# Altium footprint library PcbLib1.PcbLib: 1009 footprints (part 11 of 64)
Each footprint in its own frame and in the unit in brackets; x right, y up, seen from the top. Pads: shape width x height; smd on the part's side, far side on the other; paste and mask are expansions set on the pad; w line width, h text height; cw(c..) or ccw(c..) is an arc to the next point about the centre after c.
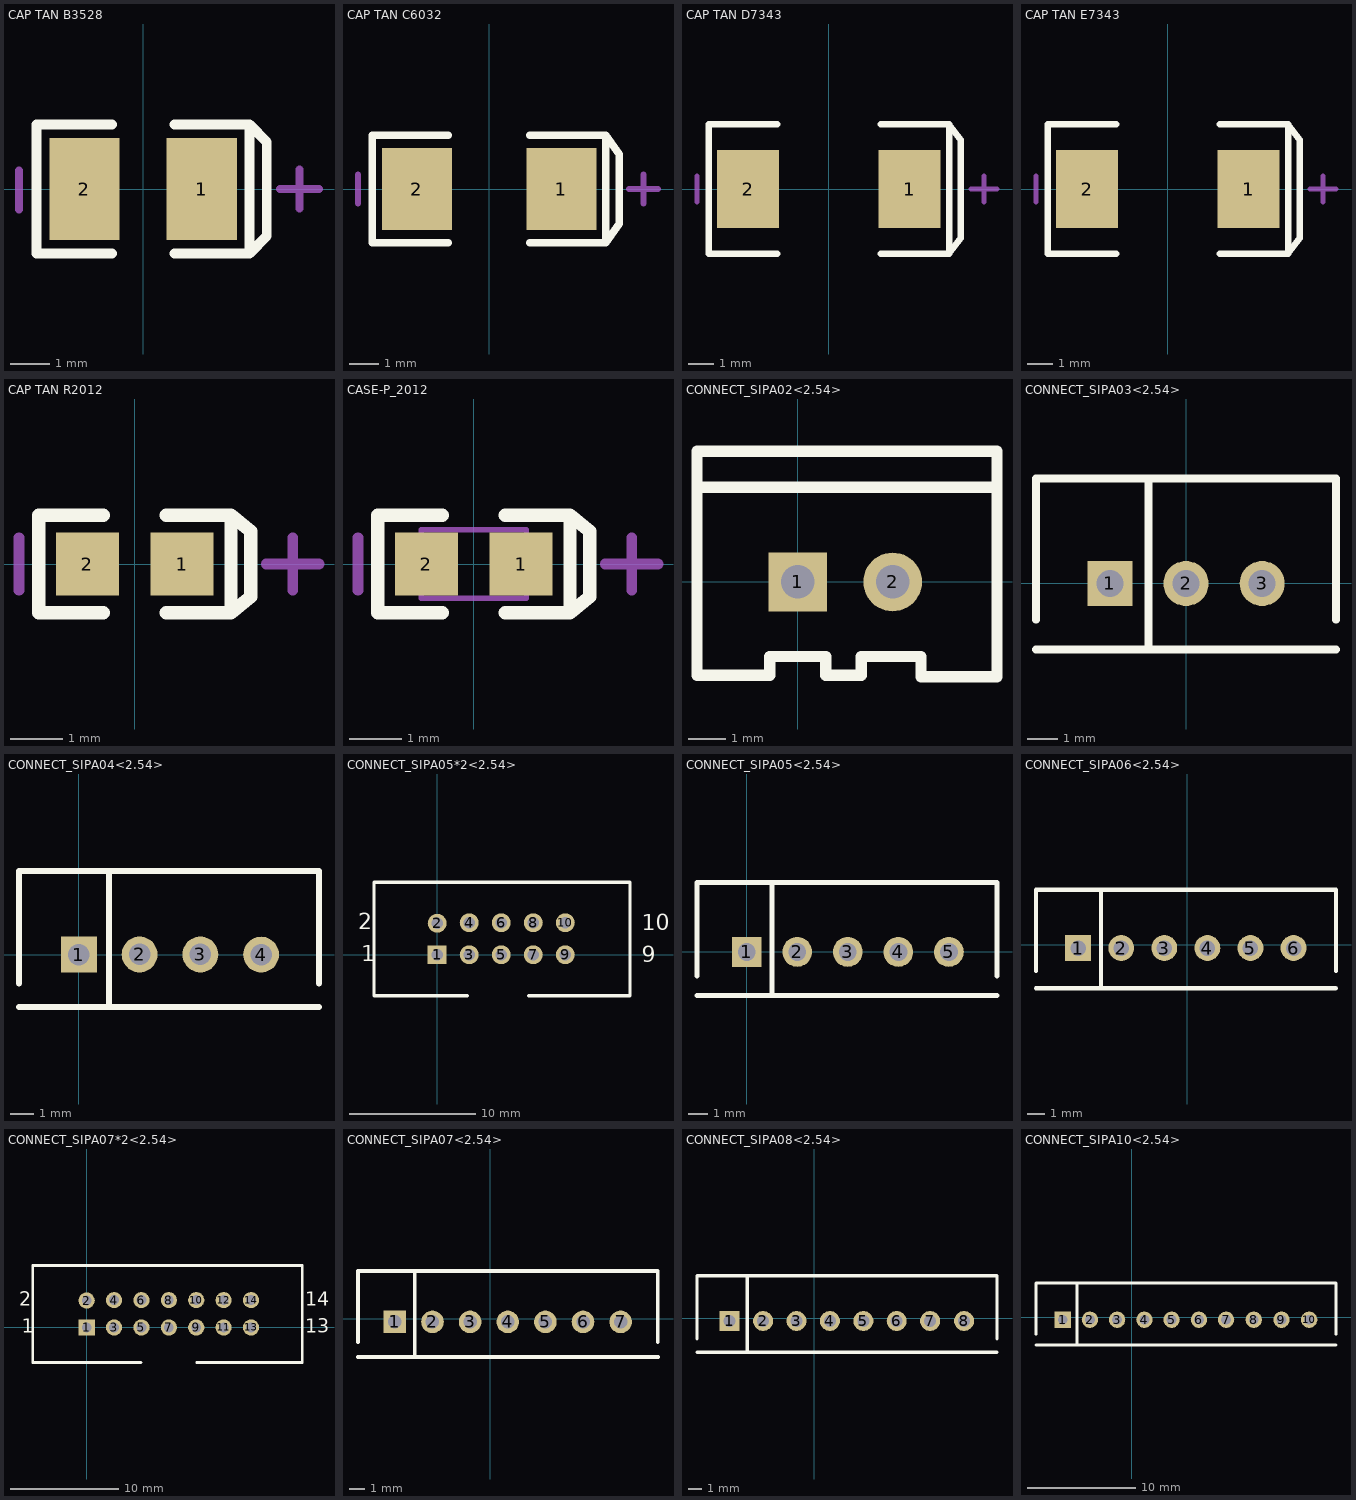
[diagram p10: the footprints below, top view; thin cyan lines are the x and y axes]

## CAP TAN B3528 [mm]
pads (2):
  rect 1.8x2.6 smd: 1(1.5,0) 2(-1.5,0)
Top Overlay:
  lines w0.254: -0.8,-1.65 -2.727,-1.65 -2.727,1.65 -0.8,1.65 ; 0.8,-1.65 2.727,-1.65 ; 0.8,1.65 2.727,1.65 ; 2.727,-1.65 3.163,-1.2 3.163,1.2 2.727,1.65 ; 2.727,-1.65 2.727,1.65
Mechanical 15:
  lines w0.203: -3.175,-0.525 -3.175,0.475 ; 3.5,0 4.5,0 ; 4,-0.5 4,0.5
3D body "User Library-AVX_BCASE.STEP": height 2.03, standoff 0, extent -1.85,-1.465 1.85,1.465

## CAP TAN C6032 [mm]
pads (2):
  rect 2.4x2.8 smd: 1(2.48,0) 2(-2.48,0)
Top Overlay:
  lines w0.254: -1.4,-1.85 -4.007,-1.85 -4.007,1.85 -1.4,1.85 ; 1.4,-1.85 4.007,-1.85 ; 1.4,1.85 4.007,1.85 ; 4.007,-1.85 4.47,-1.2 4.47,1.2 4.007,1.85 ; 4.007,-1.85 4.007,1.85
Mechanical 15:
  lines w0.203: -4.5,-0.5 -4.5,0.5 ; 4.8,0 5.8,0 ; 5.3,-0.5 5.3,0.5
3D body "User Library-AVX_C_CASE.STEP": height 2.7, standoff 0, extent -3.05,-1.675 3.05,1.675

## CAP TAN D7343 [mm]
pads (2):
  rect 2.4x3 smd: 1(3.12,0) 2(-3.12,0)
Top Overlay:
  lines w0.254: -2,-2.5 -4.647,-2.5 -4.647,2.5 -2,2.5 ; 2,-2.5 4.647,-2.5 ; 2,2.5 4.647,2.5 ; 4.647,-2.5 5.1,-1.9 5.1,1.9 4.647,2.5 ; 4.647,-2.5 4.647,2.5
Mechanical 15:
  lines w0.203: -5.1,-0.5 -5.1,0.5 ; 5.5,0 6.5,0 ; 6,-0.5 6,0.5
3D body "User Library-AVX_D_CASE.STEP": height 3.01, standoff 0, extent -3.701,-2.225 3.7,2.225

## CAP TAN E7343 [mm]
pads (2):
  rect 2.4x3 smd: 1(3.12,0) 2(-3.12,0)
Top Overlay:
  lines w0.254: -2,-2.5 -4.647,-2.5 -4.647,2.5 -2,2.5 ; 2,-2.5 4.647,-2.5 ; 2,2.5 4.647,2.5 ; 4.647,-2.5 4.647,2.5 ; 4.647,-2.5 5.1,-1.9 5.1,1.9 4.647,2.5
Mechanical 15:
  lines w0.203: -5.1,-0.5 -5.1,0.5 ; 5.5,0 6.5,0 ; 6,-0.5 6,0.5
3D body "User Library-AVX_E_CASE.STEP": height 4.2, standoff 0, extent -3.701,-2.225 3.7,2.225

## CAP TAN R2012 [mm]
pads (2):
  rect 1.2x1.2 smd: 1(0.9,0) 2(-0.9,0)
Top Overlay:
  lines w0.254: -0.6,-0.927 -1.827,-0.927 -1.827,0.927 -0.6,0.927 ; 0.6,-0.927 1.827,-0.927 ; 0.6,0.927 1.827,0.927 ; 1.827,-0.927 1.827,0.927 ; 1.827,-0.927 2.2,-0.623 2.2,0.623 1.827,0.927
Mechanical 15:
  lines w0.203: -2.2,-0.5 -2.2,0.5 ; 2.5,0 3.5,0 ; 3,-0.5 3,0.5
3D body "User Library-CaseR_2012-12.STEP": height 1.2, standoff 0, extent -1,-0.65 1,0.65

## CASE-P_2012 [mm]
pads (2):
  rect 1.2x1.2 smd: 1(0.9,0) 2(-0.9,0)
Top Overlay:
  lines w0.254: -0.6,-0.927 -1.827,-0.927 -1.827,0.927 -0.6,0.927 ; 0.6,-0.927 1.827,-0.927 ; 0.6,0.927 1.827,0.927 ; 1.827,-0.927 2.2,-0.623 2.2,0.623 1.827,0.927 ; 1.827,-0.927 1.827,0.927
Mechanical 13:
  lines w0.1: -1,-0.65 1,-0.65 1,0.65 -1,0.65 -1,-0.65
Mechanical 15:
  lines w0.203: -2.2,-0.5 -2.2,0.5 ; 2.5,0 3.5,0 ; 3,-0.5 3,0.5

## CONNECT_SIPA02<2.54> [mil]
pads (2):
  rect 62x62 hole 35.43: 1(0,0)
  round 62 hole 35.43: 2(100,0)
Top Overlay:
  lines w11.81: -106.3,-98.42 -29.53,-98.42 -29.53,-78.74 29.53,-78.74 29.53,-98.42 66.93,-98.42 ; 70.87,-78.74 66.93,-82.68 66.93,-86.61 66.93,-98.42 ; 210,-100 129.92,-100 129.92,-78.74 66.93,-78.74 66.93,-98.42
  lines w12: -106.3,-98.42 -106.3,137.79 210,137.79 ; -106.3,100 204.49,100 ; 210,-100 210,136.22
3D body "User Library-B2B-XH-A.STEP": height 279.53, standoff -129.92, extent -95.66,-92.51 195.68,133.87

## CONNECT_SIPA03<2.54> [mm] "三针白色插座（未加焊）"
pads (3):
  rect 1.5x1.5 hole 0.9: 1(-2.54,0)
  round 1.5 hole 0.9: 2(0,0) 3(2.54,0)
Top Overlay:
  lines w0.254: -5,-2.2 5,-2.2 ; -5,-1.206 -5,3.5 5,3.5 5,-1.206 ; -1.25,-2.2 -1.25,3.5
3D body "hx254-3tl_n.stp": height 7, standoff -3, extent -5.005,-2.47 4.995,3.53

## CONNECT_SIPA04<2.54> [mm] "四针白色插座（未加焊）"
height 7
pads (4):
  rect 1.5x1.5 hole 0.9: 1(0,0)
  round 1.5 hole 0.9: 2(2.54,0.003) 3(5.08,0.003) 4(7.62,0)
Top Overlay:
  lines w0.254: -2.5,-2.2 10.04,-2.2 ; -2.5,-1.206 -2.5,3.5 10.04,3.5 10.04,-1.206 ; 1.27,-2.2 1.27,3.5
3D body "hx254-4tl_n.stp": height 7, standoff -3, extent -2.45,-2.475 10.07,3.525

## CONNECT_SIPA05*2<2.54> [mm] "牛角座"
pads (10):
  rect 1.5x1.5 hole 0.9: 1(0,0)
  round 1.5 hole 0.9: 2(0,2.5) 3(2.54,0) 4(2.54,2.54) 5(5.08,0) 6(5.08,2.54) 7(7.62,0) 8(7.62,2.54) 9(10.16,0) 10(10.16,2.54)
Top Overlay:
  lines w0.254: 2.388,-3.25 -5,-3.25 -5,5.75 15.291,5.75 15.291,-3.25 7.264,-3.25
  text "9" at 16.233,-0.584 h1.27
  text "10" at 16.233,1.956 h1.27
  text "1" at -6,-0.5 h1.27
  text "2" at -6.274,2.032 h1.27
3D body "Header 2_54mm 10 Pin.step": height 9.86, standoff -3.05, extent -5.055,-3.353 15.265,5.791

## CONNECT_SIPA05<2.54> [mm] "五针白色插座（未加焊）"
height 7
pads (5):
  rect 1.5x1.5 hole 0.9: 1(0,0)
  round 1.5 hole 0.9: 2(2.54,0.003) 3(5.08,0.003) 4(7.62,0) 5(10.16,0)
Top Overlay:
  lines w0.254: -2.5,-2.2 12.58,-2.2 ; -2.5,-1.206 -2.5,3.5 12.58,3.5 12.58,-1.206 ; 1.27,-2.2 1.27,3.5
3D body "hx254-5tl_n.stp": height 7, standoff -3, extent -2.46,-2.49 12.62,3.51

## CONNECT_SIPA06<2.54> [mm]
pads (6):
  rect 1.5x1.5 hole 0.9: 1(-6.328,-0.203)
  round 1.5 hole 0.9: 2(-3.828,-0.203) 3(-1.328,-0.203) 4(1.172,-0.203) 5(3.672,-0.203) 6(6.172,-0.203)
Top Overlay:
  lines w0.254: -8.774,-2.53 8.611,-2.53 ; -8.774,-1.536 -8.774,3.17 8.636,3.17 8.636,-1.536 ; -5.004,-2.53 -5.004,3.17
3D body "6pin-2.5.step": height 7, standoff -3.4, extent -8.751,-2.57 8.649,3.18

## CONNECT_SIPA07*2<2.54> [mm] "msp430调试接口（未加焊）"
pads (14):
  rect 1.5x1.5 hole 0.9: 1(0,0)
  round 1.5 hole 0.9: 2(0,2.5) 3(2.54,0) 4(2.54,2.54) 5(5.08,0) 6(5.08,2.54) 7(7.62,0) 8(7.62,2.54) 9(10.16,0) 10(10.16,2.54) 11(12.7,0) 12(12.7,2.54) 13(15.24,0) 14(15.24,2.54)
Top Overlay:
  lines w0.254: 5.028,-3.25 -5,-3.25 -5,5.75 20,5.75 20,-3.25 10.212,-3.25
  text "13" at 20.272,-0.508 h1.27
  text "14" at 20.272,2.032 h1.27
  text "1" at -6,-0.5 h1.27
  text "2" at -6.274,2.032 h1.27
3D body "430_debug_n.stp": height 8.67, standoff -3.41, extent -5.05,-3.295 20.29,5.545

## CONNECT_SIPA07<2.54> [mm]
pads (7):
  rect 1.5x1.5 hole 0.9: 1(-6.328,-0.203)
  round 1.5 hole 0.9: 2(-3.828,-0.203) 3(-1.328,-0.203) 4(1.172,-0.203) 5(3.672,-0.203) 6(6.172,-0.203) 7(8.672,-0.203)
Top Overlay:
  lines w0.254: -8.774,-2.53 11.151,-2.53 ; -8.774,-1.536 -8.774,3.17 11.136,3.17 11.136,-1.536 ; -5.004,-2.53 -5.004,3.17

## CONNECT_SIPA08<2.54> [mm]
pads (8):
  rect 1.5x1.5 hole 0.9: 1(-6.328,-0.203)
  round 1.5 hole 0.9: 2(-3.828,-0.203) 3(-1.328,-0.203) 4(1.172,-0.203) 5(3.672,-0.203) 6(6.172,-0.203) 7(8.672,-0.203) 8(11.212,-0.203)
Top Overlay:
  lines w0.254: -8.774,-2.53 13.665,-2.53 ; -8.774,-1.536 -8.774,3.17 13.665,3.17 ; -5.004,-2.53 -5.004,3.17 ; 13.676,-1.536 13.676,3.17

## CONNECT_SIPA10<2.54> [mm]
pads (10):
  rect 1.5x1.5 hole 0.9: 1(-6.328,-0.203)
  round 1.5 hole 0.9: 2(-3.828,-0.203) 3(-1.328,-0.203) 4(1.172,-0.203) 5(3.672,-0.203) 6(6.172,-0.203) 7(8.672,-0.203) 8(11.212,-0.203) 9(13.752,-0.203) 10(16.292,-0.203)
Top Overlay:
  lines w0.254: -8.774,-2.53 18.745,-2.53 ; -8.774,-1.536 -8.774,3.17 18.756,3.17 18.756,-1.536 ; -5.004,-2.53 -5.004,3.17